# Altium schematic symbol library BARKO_SCHLIB.SchLib: 1064 symbols (part 5 of 11) (continued)
## IC-LTV-356T (continued)
OPTOISOLATOR 3.75KV TRANS 4SOP; Manufacturer: Lite-On; Maximum Collector Current: 50mA; Maximum Collector Emitter Saturation Voltage: 200mV; Product Length: 3.6mm; Number of Channels per Chip: 1; Output Type: DC; Output Device: Transistor; Maximum Power Dissipation: 170mW; Minimum Isolation Voltage: 3750Vrms; Pin_Count: 4; Product Width: 4.4mm; Maximum Collector Emitter Voltage: 80V; Maximum Current Transfer Ratio: 600%; Typical Forward Voltage: 1.2V; Product Height: 2mm; Maximum Reverse Voltage: 6V; Typical Rise Time: 4us; Maximum Forward Voltage: 1.4V; Typical Fall Time: 3us; Minimum Current Transfer Ratio: 50%; Maximum Fall Time: 18us; Rise Time: 18000ns; Washability: OK; .Creator: M.OZKAN; .PCBCHK: USED; Datasheet Version: May-09; Family: LTV-356T; Product Type: TransistorandPhotovoltaicOutputPhotoCouplers; Manufacturer URL: http://www.us.liteon.com/; Input Type: DC; Mounting: SurfaceMount; Maximum Input Current: 50mA; Minimum Operating Temperature: -55C; Supplier_Package: (Min)i-Flat; Datasheet URL: https://datasheet.ciiva.com/16216/ltv-356t-16216247.pdf; Maximum Operating Temperature: 100C; Maximum Rise Time: 18us; Supplier 1: Digi-Key; Manufacturer Part Number: LTV-356T; Stock 1: 178768; Pricing 1: 1=0.54000, 10=0.38600, 100=0.25200, 500=0.18112, 1000=0.14175 (USD); RoHS: Yes; Mount: Surface Mount; Case/Package: SMD/SMT; Number of Pins: 4; Min Operating Temperature: -55°C; Max Operating Temperature: 110°C; Forward Voltage: 1.4V; Packaging: Tape and Reel; Number of Channels: 1; Forward Current: 50mA; Collector Emitter Voltage (VCEO): 80V; Number of Elements: 1; Collector Emitter Saturation Voltage: 200mV; Max Output Voltage: 80V; Output Current per Channel: 50mA; Isolation Voltage: 3.75kV; Fall Time: 18000ns; Power Dissipation: 170mW; Current Transfer Ratio: 600%; Reverse Breakdown Voltage: 6V; Max Power Dissipation: 170mW; Max Input Current: 50mA; Package Quantity: 750; Max Collector Current: 50mA; Number of Circuits: 1; Output Voltage: 80V; Length: 3.6mm; Height: 2mm; Width: 4.4mm; Radiation Hardening: No; Lead Free: Lead Free; ComponentLink1URL: https://datasheet.ciiva.com/11771/0900766b80de6af0-11771730.pdf?src-supplier=RSComponents; ComponentLink1Description: https://datasheet.ciiva.com/11771/0900766b80de6af0-11771730.pdf?src-supplier=RSComponents; ComponentLink2URL: https://datasheet.ciiva.com/2086/ltv-356t-2086199.pdf?src-supplier=Digi-Key; ComponentLink2Description: https://datasheet.ciiva.com/2086/ltv-356t-2086199.pdf?src-supplier=Digi-Key; ComponentLink3URL: https://datasheet.ciiva.com/16216/ltv-356t-16216247.pdf?src-supplier=Future+Electronics; ComponentLink3Description: https://datasheet.ciiva.com/16216/ltv-356t-16216247.pdf?src-supplier=Future+Electronics; ComponentLink4URL: https://datasheet.ciiva.com/15118/getdatasheetpartid-214494-15118908.pdf?src-supplier=Verical; ComponentLink4Description: https://datasheet.ciiva.com/15118/getdatasheetpartid-214494-15118908.pdf?src-supplier=Verical; ComponentLink5URL: https://datasheet.ciiva.com/12243/ltv-356tseries-1308-301539-12243030.pdf?src-supplier=Mouser; ComponentLink5Description: https://datasheet.ciiva.com/12243/ltv-356tseries-1308-301539-12243030.pdf?src-supplier=Mouser; ComponentLink6URL: https://datasheet.ciiva.com/2086/s-110-ltv-356t20140520-2086200.pdf?src-supplier=Digi-Key; ComponentLink6Description: https://datasheet.ciiva.com/2086/s-110-ltv-356t20140520-2086200.pdf?src-supplier=Digi-Key; ComponentLink7URL: https://datasheet.ciiva.com/2086/s-110-ltv-356t20140520-2086201.pdf?src-supplier=Digi-Key; ComponentLink7Description: https://datasheet.ciiva.com/2086/s-110-ltv-356t20140520-2086201.pdf?src-supplier=Digi-Key; Supplier Part Number 1: 160-1337-1-ND; .SCHCHK: USED
footprint LTST-LTV-356T-4_V (SMD, 4-Leads, Body 4.6x4.15mm, Pitch 2.54mm)
pins: 1, 2, 3, 4

## IC-LTV-814S-TA1
designator U?, comment LTV-814
OPTOISOLATR 5KV TRANSISTOR 4-SMD; Manufacturer: Vishay Lite-On; Manufacturer Part Number: LTV-814S-TA1; Number of Channels: 1; Collector Emitter Voltage (VCEO): 35V; Forward Voltage: 1.4V; Forward Current: 50mA; Rise Time: 18000ns; Max Power Dissipation: 200mW; Collector Emitter Saturation Voltage: 200mV; Current Transfer Ratio: 300%; Washability: OK; .Creator: M.OZKAN; .PCBCHK: USED; Supplier 1: Digi-Key; Stock 1: 31670; Pricing 1: 1=0,52000, 10=0,40500, 100=0,25940, 500=0,22304 (USD); RoHS: Yes; Mount: Surface Mount; Case/Package: SMD/SMT; Number of Pins: 4; Min Operating Temperature: -30°C; Max Operating Temperature: 110°C; Package Quantity: 1000; Packaging: Tape and Reel; Max Output Voltage: 35V; Output Current per Channel: 50mA; Max Collector Current: 50mA; Output Voltage: 35V; Number of Elements: 1; Power Dissipation: 200mW; Fall Time: 18000ns; Max Input Current: 50mA; Isolation Voltage: 5kV; Number of Circuits: 1; Radiation Hardening: No; Lead Free: Lead Free; ComponentLink1URL: https://datasheet.ciiva.com/15118/getdatasheetpartid-130408-15118735.pdf?src-supplier=Verical; ComponentLink1Description: https://datasheet.ciiva.com/15118/getdatasheetpartid-130408-15118735.pdf?src-supplier=Verical; ComponentLink2URL: https://datasheet.ciiva.com/26923/getdatasheetpartid-768366-26923462.pdf?src-supplier=Verical; ComponentLink2Description: https://datasheet.ciiva.com/26923/getdatasheetpartid-768366-26923462.pdf?src-supplier=Verical; Supplier Part Number 1: 160-1891-1-ND; .SCHCHK: USED
footprint 4-SMD, Gull Wing (SOP, 4-Leads, Body 4,60x6,50mm, Pitch 2,54mm, IPC Medium Density)
pins: 1, 2, 3, 4

## IC-LTV-817S
designator U?, comment LTV-817S
OPTOISOLATR 5KV TRANSISTOR 4-SMD; Manufacturer: Vishay Lite-On; Rise Time: 18000ns; Number of Channels: 1; Reverse Breakdown Voltage: 6V; Forward Voltage: 1.4V; Forward Current: 50mA; Max Power Dissipation: 200mW; Collector Emitter Voltage (VCEO): 35V; Collector Emitter Saturation Voltage: 200mV; Current Transfer Ratio: 600%; Washability: OK; .Creator: M.OZKAN; .PCBCHK: USED; Supplier 1: Digi-Key; Manufacturer Part Number: LTV-817S; Stock 1: 16443; Pricing 1: 1=0,45000, 10=0,32600, 100=0,21280, 500=0,15296, 1000=0,11970, 2500=0,10972, 5000=0,09975, 10000=0,09310, 25000=0,08978 (USD); RoHS: Yes; Mount: Surface Mount; Case/Package: SMD/SMT; Number of Pins: 4; Min Operating Temperature: -30°C; Max Operating Temperature: 110°C; Packaging: Rail/Tube; Max Output Voltage: 35V; Output Current per Channel: 50mA; Max Collector Current: 50mA; Reverse Voltage (DC): 6V; Fall Time: 18000ns; Max Input Current: 50mA; Isolation Voltage: 5kV; Number of Elements: 1; Power Dissipation: 200mW; Number of Circuits: 1; Output Voltage: 35V; Radiation Hardening: No; Lead Free: Lead Free; ComponentLink1URL: https://datasheet.ciiva.com/15118/getdatasheetpartid-147501-15118828.pdf?src-supplier=Verical; ComponentLink1Description: https://datasheet.ciiva.com/15118/getdatasheetpartid-147501-15118828.pdf?src-supplier=Verical; ComponentLink2URL: https://datasheet.ciiva.com/16222/ltv-817s-16222350.pdf?src-supplier=Future+Electronics; ComponentLink2Description: https://datasheet.ciiva.com/16222/ltv-817s-16222350.pdf?src-supplier=Future+Electronics; ComponentLink3URL: https://datasheet.ciiva.com/2086/s-110-ltv-817m-s-s-ta-s-ta1-s-tpseries20130925-2086297.pdf?src-supplier=Digi-Key; ComponentLink3Description: https://datasheet.ciiva.com/2086/s-110-ltv-817m-s-s-ta-s-ta1-s-tpseries20130925-2086297.pdf?src-supplier=Digi-Key; Supplier Part Number 1: 160-1367-5-ND; .SCHCHK: USED
footprint 4-SMD, Gull Wing (SOP, 4-Leads, Body 4,60x6,50mm, Pitch 2,54mm, IPC Medium Density)
pins: 1, 2, 3, 4

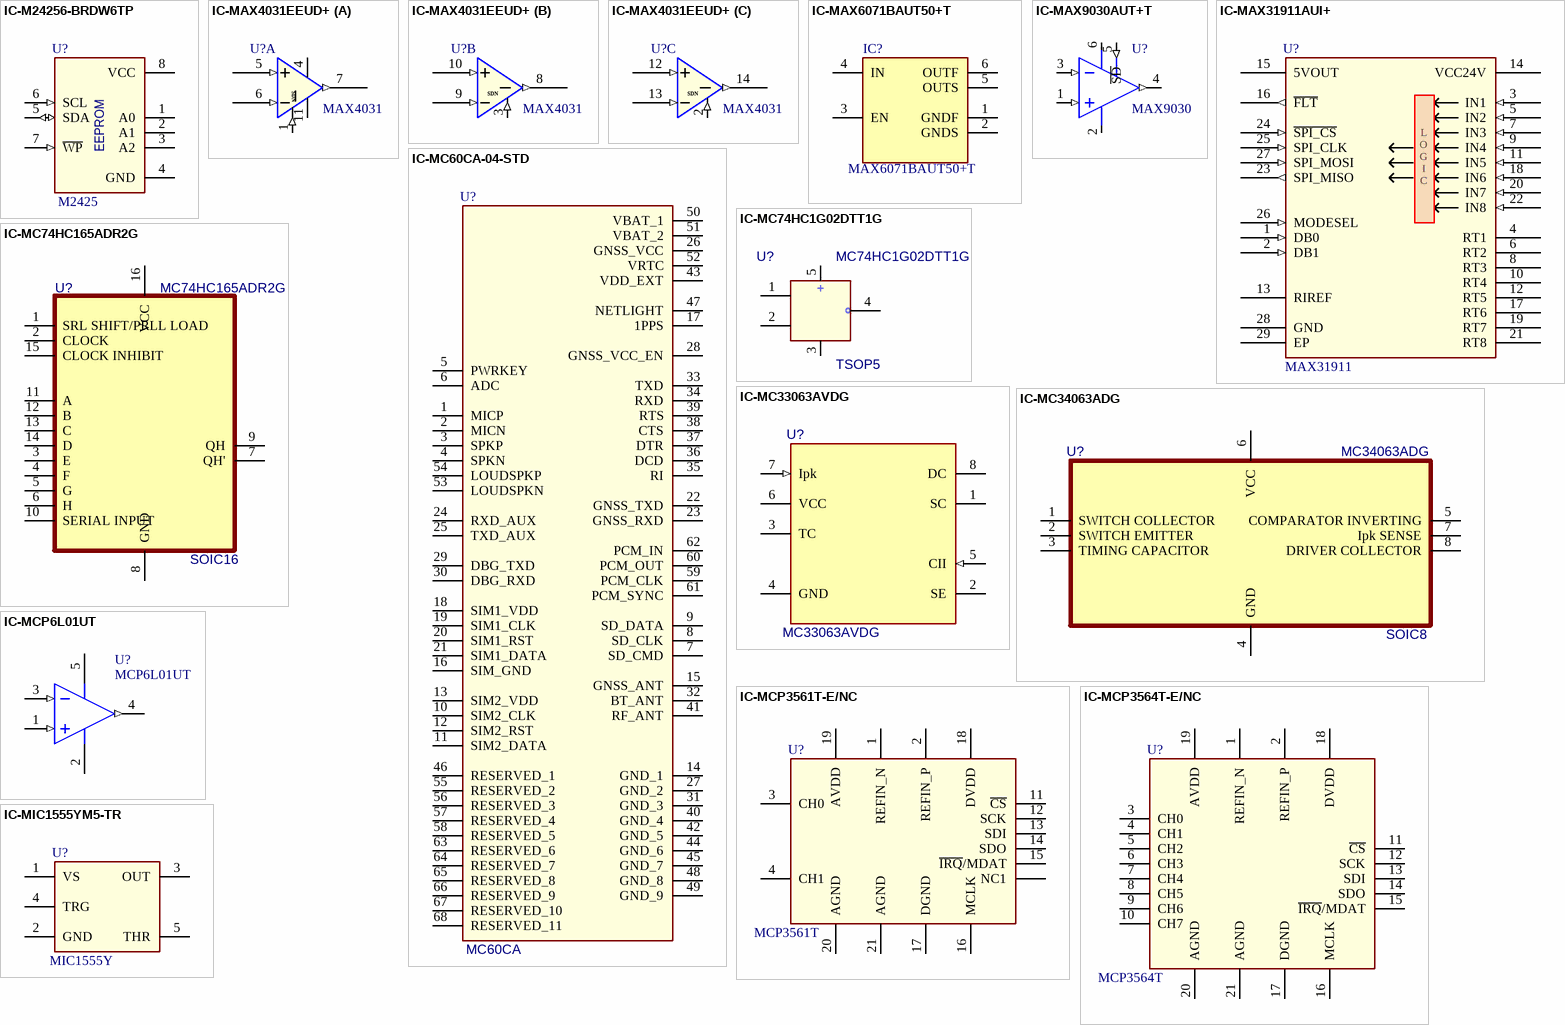
[diagram p15: symbols IC-M24256-BRDW6TP to IC-MIC1555YM5-TR]

## IC-M24256-BRDW6TP
designator U?, comment M2425
IC EEPROM 256K I2C 1MHZ 8TSSOP; Manufacturer: STMicroelectronics; Manufacturer Part Number: M24256-BRDW6TP; Max Supply Voltage: 5.5V; Min Supply Voltage: 1.8V; Interface: I2C,Serial,2-Wire; Access Time: 450ns; Nominal Supply Current: 2.5mA; Density: 256Kb; Operating Supply Voltage: 5V; Max Frequency: 400kHz; Washability: OK; .Creator: M.OZKAN; .PCBCHK: USED; Supplier 1: Digi-Key; Stock 1: 12356; Pricing 1: 1=0,38000, 10=0,37300, 100=0,30580, 500=0,29730, 1000=0,28933 (USD); RoHS: Yes; Mount: Surface Mount; Case/Package: TSSOP; Number of Pins: 8; Contact Plating: Gold; Min Operating Temperature: -40°C; Max Operating Temperature: 85°C; Package Quantity: 1; Packaging: Tape and Reel; Frequency: 1MHz; Memory Type: EEPROM; Memory Size: 256Kb; Length: 3mm; Height: 1mm; Width: 4.4mm; Radiation Hardening: No; Lead Free: Lead Free; ComponentLink1URL: https://datasheet.ciiva.com/41455/001185583-da-01-en-ic-eeprom-256-m24256-brdw6tp-tssop-8-stm-41455200.pdf?src-supplier=Conrad; ComponentLink1Description: https://datasheet.ciiva.com/41455/001185583-da-01-en-ic-eeprom-256-m24256-brdw6tp-tssop-8-stm-41455200.pdf?src-supplier=Conrad; ComponentLink2URL: https://datasheet.ciiva.com/1905/cd00001891-1905173.pdf?src-supplier=Digi-Key; ComponentLink2Description: https://datasheet.ciiva.com/1905/cd00001891-1905173.pdf?src-supplier=Digi-Key; ComponentLink3URL: https://datasheet.ciiva.com/1905/cd00001891-1905174.pdf?src-supplier=Digi-Key; ComponentLink3Description: https://datasheet.ciiva.com/1905/cd00001891-1905174.pdf?src-supplier=Digi-Key; ComponentLink4URL: https://datasheet.ciiva.com/1905/cd00001891-1905175.pdf?src-supplier=Digi-Key; ComponentLink4Description: https://datasheet.ciiva.com/1905/cd00001891-1905175.pdf?src-supplier=Digi-Key; ComponentLink5URL: https://datasheet.ciiva.com/26910/getdatasheetpartid-160036-26910538.pdf?src-supplier=Verical; ComponentLink5Description: https://datasheet.ciiva.com/26910/getdatasheetpartid-160036-26910538.pdf?src-supplier=Verical; ComponentLink6URL: https://datasheet.ciiva.com/16390/cd00001891-16390334.pdf?src-supplier=Future+Electronics; ComponentLink6Description: https://datasheet.ciiva.com/16390/cd00001891-16390334.pdf?src-supplier=Future+Electronics; Supplier Part Number 1: 497-6347-1-ND; .SCHCHK: USED
footprint TSSOP8
pins: 1 A0, 2 A1, 3 A2, 4 GND (power), 5 SDA (io), 6 SCL (in), 7 ~{WP} (in), 8 VCC (power)

## IC-MAX4031EEUD+
designator U?, comment MAX4031
IC OP AMP TRPL 144MHZ 14-TSSOP; Manufacturer 1: Maxim; Manufacturer Part Number 1: MAX4031EEUD+; Min Supply Voltage: 4.5V; Max Supply Voltage: 5.5V; Voltage Gain: 70dB; Slew Rate: 115V/µs; Common Mode Rejection Ratio: 50dB; Nominal Supply Current: 12mA; Max Power Dissipation: 727mW; Output Current: 100mA; Number of Circuits: 3; Input Offset Voltage (Vos): 13mV; Number of Channels: 1; Input Bias Current: 1uA; Power Supply Rejection Ratio (PSRR): 60dB; Washability: OK; .Creator: M.OZKAN; .PCBCHK: USED; Supplier 1: Mouser; Stock 1: 172; Pricing 1: 1=1,62000, 10=1,47000, 25=1,39000, 50=1,36000, 100=1,20000, 250=1,13000 (USD); RoHS: Yes; Mount: Surface Mount; Case/Package: TSSOP; Number of Pins: 14; Min Operating Temperature: -40°C; Max Operating Temperature: 85°C; Packaging: Rail/Tube; Package Quantity: 96; -3db Bandwidth: 144MHz; Bandwidth: 144MHz; Operating Supply Current: 12mA; Output Current per Channel: 100mA; Gain Bandwidth Product: 144MHz; Radiation Hardening: No; ComponentLink1URL: https://datasheet.ciiva.com/14464/max4030e-max4031e-14464888.pdf?src-supplier=Avnet; ComponentLink1Description: https://datasheet.ciiva.com/14464/max4030e-max4031e-14464888.pdf?src-supplier=Avnet; ComponentLink2URL: https://datasheet.ciiva.com/1824/max4030e-max4031e-1824459.pdf?src-supplier=Digi-Key; ComponentLink2Description: https://datasheet.ciiva.com/1824/max4030e-max4031e-1824459.pdf?src-supplier=Digi-Key; Supplier Part Number 1: 700-MAX4031EEUD; .SCHCHK: USED
footprint TSSOP-14
part A pins: 1 ~{SHNDA} (in), 4 VCC (power), 5 INA+ (in), 6 INA- (in), 7 OUTA (out), 11 GND (power)
part B pins: 3 ~{SHNDB} (in), 8 OUTB (out), 9 INB- (in), 10 INB+ (in)
part C pins: 2 ~{SHNDC} (in), 12 INC+ (in), 13 INC- (in), 14 OUTC (out)
part A text: SDN
part B text: SDN
part C text: SDN

## IC-MAX6071BAUT50+T
designator IC?, comment MAX6071BAUT50+T
Voltage References Unfiltered 5V .08% Accuracy VR; Manufacturer: Maxim; Temperature Coefficient: 8ppm/°C; Quiescent Current: 250uA; Output Current: 10mA; Operating Supply Current: 330uA; Max Input Voltage: 5.5V; Min Input Voltage: 2.7V; Tolerance: 0.08%; Number of Channels: 1; Output Type: Fixed; Reference Type: Series; Supplier 1: Mouser; Manufacturer Part Number: MAX6071BAUT50+T; Stock 1: 2336; Pricing 1: 1=2,37000, 10=1,92000, 25=1,75000, 50=1,74000, 100=1,47000, 250=1,26000 (USD); RoHS: Yes; Mount: Surface Mount; Case/Package: SOT-23-6; Min Operating Temperature: -40°C; Max Operating Temperature: 125°C; Min Output Voltage: 5V; Output Voltage: 5V; Packaging: Tape and Reel; Package Quantity: 2500; ComponentLink1URL: https://datasheet.ciiva.com/12204/max6070-max6071-217862-12204352.pdf?src-supplier=Mouser; ComponentLink1Description: https://datasheet.ciiva.com/12204/max6070-max6071-217862-12204352.pdf?src-supplier=Mouser; Supplier Part Number 1: 700-MAX6071BAUT50+T
footprint SOT-23-6 L (MAX6071BAUT50+T)
pins: 1 GNDF (power), 2 GNDS (power), 3 EN, 4 IN, 5 OUTS, 6 OUTF

## IC-MAX9030AUT+T
designator U?, comment MAX9030
IC COMPARATOR SNGL SOT23-6; Manufacturer: Maxim; Manufacturer Part Number: MAX9030AUT+T; Min Dual Supply Voltage: 1.25V; Max Supply Voltage: 5.5V; Min Supply Voltage: 2.5V; Max Dual Supply Voltage: 2.75V; Max Power Dissipation: 696mW; Nominal Supply Current: 35uA; Number of Elements: 1; Propagation Delay: 228ns; Common Mode Rejection Ratio: 100dB; Input Bias Current: 8nA; Input Offset Voltage (Vos): 1mV; Quiescent Current: 55uA; Hysteresis: 4mV; Response Time: 188ns; Output Type: TTL; Washability: OK; .Creator: M.OZKAN; .PCBCHK: USED; Supplier 1: Digi-Key; Stock 1: 1400; Pricing 1: 1=0.67000, 10=0.59600, 25=0.56520, 100=0.43400, 250=0.38356, 500=0.36338, 1000=0.34608 (USD); RoHS: Yes; Mount: Surface Mount; Case/Package: SOT-23-6; Number of Pins: 6; Contact Plating: Gold; Min Operating Temperature: -40°C; Max Operating Temperature: 125°C; Packaging: Tape and Reel; Package Quantity: 2500; Max Supply Current: 35uA; Number of Channels: 1; Max Input Current: 8nA; Power Supply Rejection Ratio (PSRR): 100dB; Type: General Purpose; Radiation Hardening: No; REACH SVHC: Unknown; Lead Free: Lead Free; ComponentLink1URL: https://datasheet.ciiva.com/2970/max9030-max9034-2970983.pdf?src-supplier=Avnet; ComponentLink1Description: https://datasheet.ciiva.com/2970/max9030-max9034-2970983.pdf?src-supplier=Avnet; ComponentLink2URL: https://datasheet.ciiva.com/1828/max9030-max9034-1828093.pdf?src-supplier=Digi-Key; ComponentLink2Description: https://datasheet.ciiva.com/1828/max9030-max9034-1828093.pdf?src-supplier=Digi-Key; ComponentLink3URL: https://datasheet.ciiva.com/1828/max9030-max9034-1828094.pdf?src-supplier=Digi-Key; ComponentLink3Description: https://datasheet.ciiva.com/1828/max9030-max9034-1828094.pdf?src-supplier=Digi-Key; ComponentLink4URL: https://datasheet.ciiva.com/1828/max9030-max9034-1828095.pdf?src-supplier=Digi-Key; ComponentLink4Description: https://datasheet.ciiva.com/1828/max9030-max9034-1828095.pdf?src-supplier=Digi-Key; Supplier Part Number 1: MAX9030AUT+TCT-ND; .SCHCHK: USED
footprint SOT23-6
pins: 1 IN+ (in), 2 V- (power), 3 IN- (in), 4 OUT (out), 5 ~{SD} (in), 6 V+ (power)

## IC-MAX31911AUI+
designator U?, comment MAX31911
IC SERIALIZER SPI 28TSSOP; Manufacturer Part Number: MAX31911AUI+; Manufacturer: Maxim; Number of Inputs: 8; Number of Outputs: 1; Min Supply Voltage: 7V; Max Supply Voltage: 36V; Washability: OK; .Creator: M.OZKAN; .PCBCHK: USED; Supplier 1: Digi-Key; Stock 1: 986; Pricing 1: 1=3,05000, 10=2,74200, 25=2,59200, 100=2,13120, 250=1,91232, 500=1,84320, 1000=1,72800 (USD); RoHS: Yes; Case/Package: TSSOP; Number of Pins: 28; Weight: 0.014215oz; Min Operating Temperature: -40°C; Max Operating Temperature: 125°C; Package Quantity: 1; Packaging: Rail/Tube; REACH SVHC: Unknown; ComponentLink1URL: https://datasheet.ciiva.com/14084/max31911-14084586.pdf?src-supplier=Digi-Key; ComponentLink1Description: https://datasheet.ciiva.com/14084/max31911-14084586.pdf?src-supplier=Digi-Key; Supplier Part Number 1: MAX31911AUI+-ND; .SCHCHK: USED
footprint TSSOP28-EP
pins: 1 DB0 (in), 2 DB1 (in), 3 IN1 (in), 4 RT1 (power), 5 IN2 (in), 6 RT2 (power), 7 IN3 (in), 8 RT3 (power), 9 IN4 (in), 10 RT4 (power), 11 IN5 (in), 12 RT5 (power), 13 RIREF, 14 VCC24V (power), 15 5VOUT (oe), 16 ~{FLT} (out), 17 RT6 (power), 18 IN6 (in), 19 RT7 (power), 20 IN7 (in), 21 RT8 (power), 22 IN8 (in), 23 SPI_MISO (out), 24 ~{SPI_CS} (in), 25 SPI_CLK (in), 26 MODESEL (in), 27 SPI_MOSI (in), 28 GND (power), 29 EP
text: L / O / G / I / C

## IC-MC60CA-04-STD
designator U?, comment MC60CA
Quad-Band GSM/GPRS/GNSS Module LCC; Manufacturer Part Number: MC60CA-04-STD; Manufacturer: Quectel Wireless Solutions; Washability: OK; .Creator: M.OZKAN; .PCBCHK: USED; ComponentLink1Description: Datasheet; ComponentLink1URL: https://www.quectel.com/UploadFile/Product/Quectel_MC60_GSM_Combo_Specification_V1.3.pdf; Min Operating Temperature: -40; Max Operating Temperature: 85; Supplier 1: Avnet; Supplier Part Number 1: MC60CA-04-STD; Stock 1: 0; Pricing 1: 250=12.15000, 500=11.99221, 1000=11.68860, 1500=11.40001, 2500=11.12531 (USD); RoHS: No; .SCHCHK: USED
footprint PQFN54 - 68 Pins (PQFN, 54-Leads, Body 18.60x21.30mm, Pitch 1.00mm, IPC Medium Density)
pins: 1 MICP, 2 MICN, 3 SPKP, 4 SPKN, 5 PWRKEY, 6 ADC, 7 SD_CMD, 8 SD_CLK, 9 SD_DATA, 10 SIM2_CLK, 11 SIM2_DATA, 12 SIM2_RST, 13 SIM2_VDD, 14 GND_1, 15 GNSS_ANT, 16 SIM_GND, 17 1PPS, 18 SIM1_VDD, 19 SIM1_CLK, 20 SIM1_RST, 21 SIM1_DATA, 22 GNSS_TXD, 23 GNSS_RXD, 24 RXD_AUX, 25 TXD_AUX, 26 GNSS_VCC, 27 GND_2, 28 GNSS_VCC_EN, 29 DBG_TXD, 30 DBG_RXD, 31 GND_3, 32 BT_ANT, 33 TXD, 34 RXD, 35 RI, 36 DCD, 37 DTR, 38 CTS, 39 RTS, 40 GND_4, 41 RF_ANT, 42 GND_5, 43 VDD_EXT, 44 GND_6, 45 GND_7, 46 RESERVED_1, 47 NETLIGHT, 48 GND_8, 49 GND_9, 50 VBAT_1, 51 VBAT_2, 52 VRTC, 53 LOUDSPKN, 54 LOUDSPKP, 55 RESERVED_2, 56 RESERVED_3, 57 RESERVED_4, 58 RESERVED_5, 59 PCM_CLK, 60 PCM_OUT, 61 PCM_SYNC, 62 PCM_IN, 63 RESERVED_6, 64 RESERVED_7, 65 RESERVED_8, 66 RESERVED_9, 67 RESERVED_10, 68 RESERVED_11

## IC-MC74HC1G02DTT1G
designator U?, comment MC74HC1G02DTT1G  Case/Package: TSOP5
IC GATE NOR 1CH 2-INP 5-TSOP; Manufacturer: ON Semiconductor; Max Output Current: 12.5mA; Propagation Delay: 155ns; Max Supply Voltage: 6V; Min Supply Voltage: 2V; Number of Outputs: 1; Output Current: 2.6mA; Number of Inputs: 2; Quiescent Current: 1uA; High Level Output Current: -2.6mA; Turn-On Delay Time: 100ns; Schmitt Trigger Input: No; .PCBCHK: USED; .Creator: F:TALI; Washability: OK; Supplier 1: Digi-Key; Manufacturer Part Number: MC74HC1G02DTT1G; Stock 1: 9000; Pricing 1: 1=0.33, 10=0.249, 100=0.1409, 500=0.09334, 1000=0.07155 (USD); Mount: Surface Mount; Number of Pins: 5; Min Operating Temperature: -55°C; Max Operating Temperature: 125°C; Packaging: Tape and Reel; Logic Function: NOR; Number of Gates: 1; Package Quantity: 1; Number of Circuits: 1; Low Level Output Current: 2.6mA; Number of Elements: 1; Termination: SMD/SMT; Length: 3mm; Height: 1mm; Width: 1.5mm; Radiation Hardening: No; REACH SVHC: No SVHC; Lead Free: Lead Free; Halogen Free: Halogen Free; ComponentLink1URL: http://www.onsemi.com/pub/Collateral/MC74HC1G02-D.PDF; ComponentLink1Description: http://www.onsemi.com/pub/Collateral/MC74HC1G02-D.PDF; ComponentLink2URL: http://www.onsemi.com/pub_link/Collateral/MC74HC1G02-D.PDF; ComponentLink2Description: http://www.onsemi.com/pub_link/Collateral/MC74HC1G02-D.PDF; ComponentLink3URL: http://www.farnell.com/datasheets/1840555.pdf; ComponentLink3Description: http://www.farnell.com/datasheets/1840555.pdf; Supplier Part Number 1: MC74HC1G02DTT1GOSDKR-ND; .SCHCHK: USED
footprint TSOP5
pins: 1 B, 2 A, 3 GND, 4 Y, 5 VCC

## IC-MC74HC165ADR2G
designator U?, comment MC74HC165ADR2G  Case/Package: SOIC16
IC SHIFT REGISTER 8BIT 16SOIC; Manufacturer: ON Semiconductor; Logic Function: OR,Shift Register; Number of Elements: 1; Direction: Unidirectional; Max Supply Voltage: 6V; Min Supply Voltage: 2V; Propagation Delay: 265ns; Number of Inputs: 9; Number of Bits: 8; Quiescent Current: 4uA; .PCBCHK: USED; .Creator: F:TALI; Washability: OK; Supplier 1: Digi-Key; Manufacturer Part Number: MC74HC165ADR2G; Stock 1: 21092; Pricing 1: 1=0.49, 10=0.397, 100=0.2703, 500=0.2027, 1000=0.15203 (USD); Mount: Surface Mount; Number of Pins: 16; Weight: 0.023492oz; Contact Plating: Matte,Tin; Min Operating Temperature: -55°C; Max Operating Temperature: 125°C; Packaging: Tape and Reel; Package Quantity: 2500; Number of Circuits: 1; Number of Input Lines: 9; Number of Output Lines: 1; Number of Bits per Element: 8; Turn-On Delay Time: 265ns; Length: 10mm; Height: 1.5mm; Width: 4mm; Radiation Hardening: No; REACH SVHC: No SVHC; Lead Free: Lead Free; Halogen Free: Halogen Free; ComponentLink1URL: http://www.onsemi.com/pub/Collateral/MC74HC165A-D.PDF; ComponentLink1Description: http://www.onsemi.com/pub/Collateral/MC74HC165A-D.PDF; ComponentLink2URL: http://www.onsemi.com/pub_link/Collateral/MC74HC165A-D.PDF; ComponentLink2Description: http://www.onsemi.com/pub_link/Collateral/MC74HC165A-D.PDF; ComponentLink3URL: http://www.jameco.com/Jameco/Products/ProdDS/973355.pdf; ComponentLink3Description: http://www.jameco.com/Jameco/Products/ProdDS/973355.pdf; ComponentLink4URL: https://www.verical.com/server-webapp/html/getDatasheet?partID=245859; ComponentLink4Description: https://www.verical.com/server-webapp/html/getDatasheet?partID=245859; Supplier Part Number 1: MC74HC165ADR2GOSDKR-ND; .SCHCHK: USED
footprint SOIC16
pins: 1 SRL SHIFT/PRLL LOAD, 2 CLOCK, 3 E, 4 F, 5 G, 6 H, 7 QH', 8 GND, 9 QH, 10 SERIAL INPUT, 11 A, 12 B, 13 C, 14 D, 15 CLOCK INHIBIT, 16 VCC

## IC-MC33063AVDG
designator U?, comment MC33063AVDG